# Altium footprint library Footprints.PcbLib: 76 footprints (part 5 of 5)
Each footprint in its own frame and in the unit in brackets; x right, y up, seen from the top. Pads: shape width x height; smd on the part's side, far side on the other; paste and mask are expansions set on the pad; w line width, h text height; cw(c..) or ccw(c..) is an arc to the next point about the centre after c.
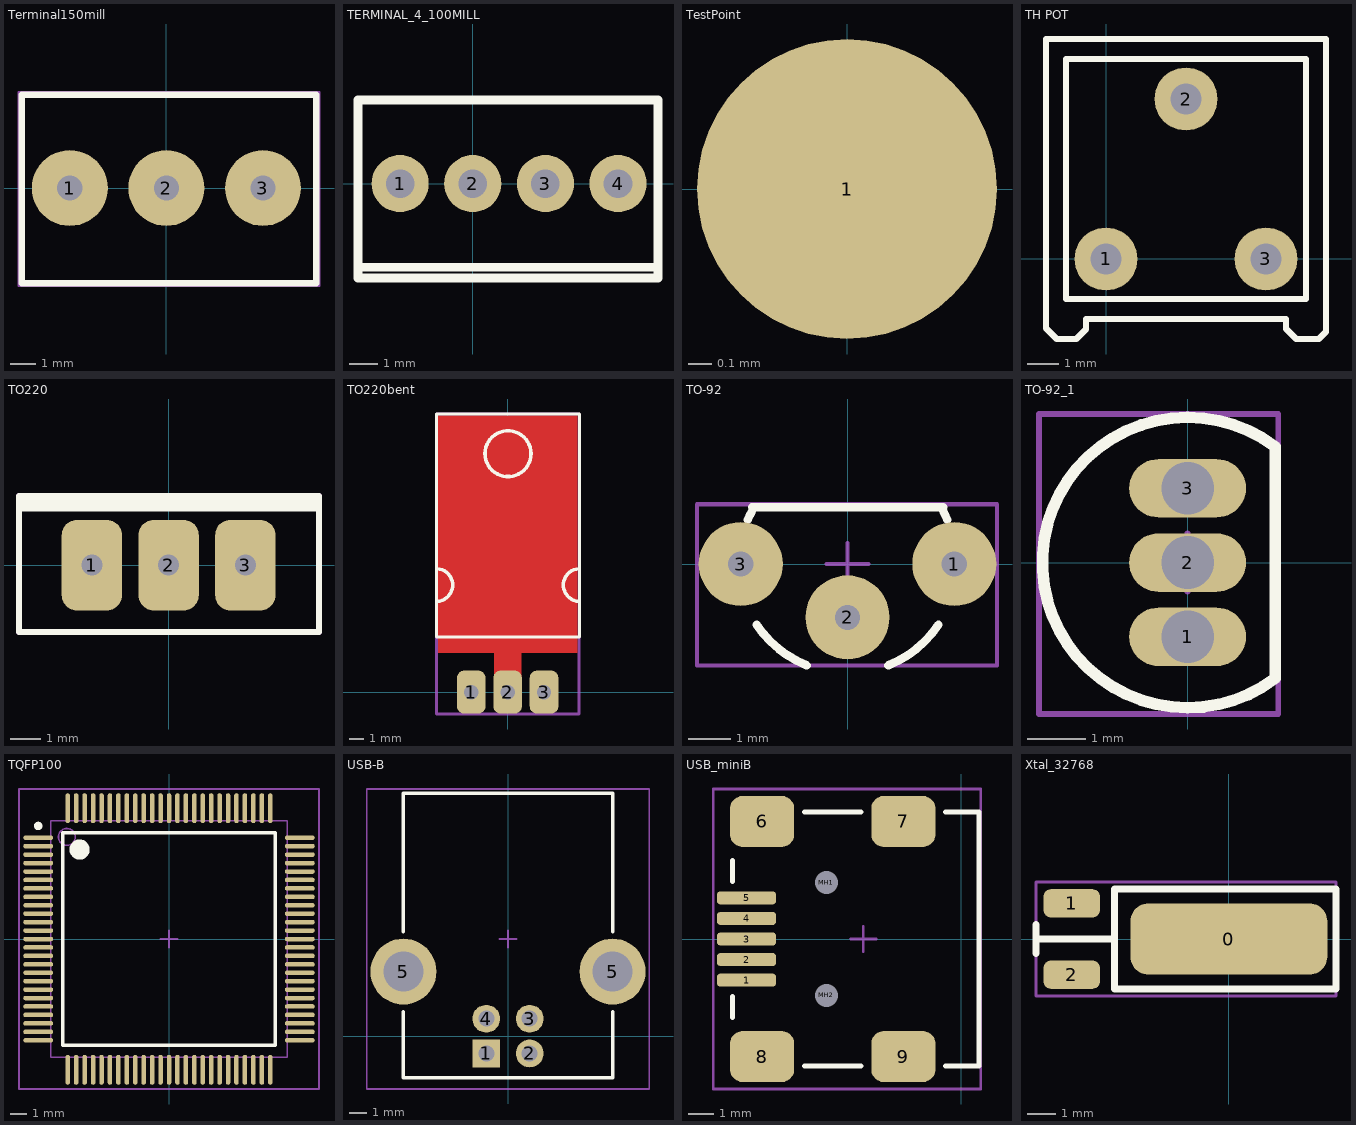
[diagram p4: the footprints below, top view; thin cyan lines are the x and y axes]

## Terminal150mill [mm]
height 8
pads (3):
  round 3 hole 1: 1(-3.81,0) 2(0,0) 3(3.81,0)
Top Overlay:
  lines w0.254: -5.715,-3.759 -5.715,3.683 5.918,3.683 5.918,-3.759 -5.715,-3.759
Mechanical 15:
  lines w0.1: -0.5,0 0.5,0 ; 0,-0.5 0,0.5 ; -5.817,-3.861 -5.817,3.785 6.02,3.785 6.02,-3.861 -5.817,-3.861
3D body "SkrewTerminal 150mill pitch.step": height 8.5, standoff -3.5, extent -5.715,-3.75 5.915,3.75

## TERMINAL_4_100MILL [mm] "Skrew terminal 2.54mm"
height 8.5
pads (4):
  round 2 hole 1: 1(-2.54,0) 2(0,0) 3(2.54,0) 4(5.08,0)
Top Overlay:
  lines w0.3: -3.81,-2.921 6.452,-2.921 ; -4.013,-3.302 6.477,-3.302 6.477,2.921 -4.013,2.921 -4.013,-3.302
Mechanical 15:
  lines w0.1: -0.5,0 0.5,0 ; 0,-0.5 0,0.5 ; -4.013,-3.302 6.477,-3.302 6.477,2.921 -4.013,2.921 -4.013,-3.302
3D body "Terminal2 2.54.step": height 8.64, standoff -1.91, extent -3.982,-3.251 1.238,2.972
3D body "Terminal2 2.54.step": height 8.64, standoff -1.91, extent 1.225,-3.251 6.445,2.972

## TestPoint [mm] "Testpad"
pads (1):
  round 1.3 smd paste-2: 1(0,0)

## TH POT [mm]
pads (3):
  round 2 hole 1: 1(0,0) 2(2.54,5.08) 3(5.08,0)
Top Overlay:
  lines w0.2: -1.905,-2.195 -1.905,6.985 6.985,6.985 6.985,-2.315 6.76,-2.54 6.04,-2.54 5.715,-2.215 5.715,-1.905 -0.635,-1.905 -0.635,-2.235 -0.94,-2.54 -1.56,-2.54 -1.905,-2.195 ; -1.27,-1.27 6.35,-1.27 6.35,6.35 -1.27,6.35 -1.27,-1.27

## TO220 [mm] "TO220 Power device"
height 22
pads (3):
  rrect50% 2x3 hole 0.7: 1(-2.54,0) 2(0,0) 3(2.54,0)
Top Overlay:
  lines w0.2: -4.953,1.905 -4.953,1.88 4.978,1.88 ; -4.902,2.083 4.978,2.083 4.978,2.057 ; -4.953,-2.21 4.978,-2.21 4.978,2.286 -4.953,2.286 -4.953,-2.21
Mechanical 15:
  lines w0.1: -0.5,0 0.5,0 ; 0,-0.5 0,0.5
  lines w0.2: -4.953,-2.21 -4.953,2.286 4.978,2.286 4.978,-2.21 -4.953,-2.21
3D body "TO220.step": height 18.8, standoff -9.98, extent -4.95,-2.214 4.95,2.286

## TO220bent [mm] "TO220 Power device"
height 6
pads (3):
  rrect50% 2x3 hole 1: 1(-2.54,0) 2(0,0) 3(2.54,0)
Top Layer:
  rectangle: -4.851,2.743 4.877,19.304
  rectangle: -0.965,0.686 0.965,2.845
Top Overlay:
  circle w0.254: c0.025,16.637 r1.6
  lines w0.2: -4.953,3.835 5.004,3.835 5.004,19.406 -4.953,19.406 -4.953,3.835
  lines w0.254: -4.914,8.611 cw(c-4.981,7.468) -4.904,6.325 ; 4.955,6.325 cw(c5.032,7.468) 4.965,8.611
Mechanical 15:
  lines w0.1: -0.5,9.906 0.5,9.906 ; 0,9.406 0,10.406
  lines w0.2: -4.953,-1.524 -4.953,2.286 -4.953,19.406 2.108,19.406 4.978,19.406 4.978,-1.524 -4.953,-1.524
3D body "TO220 L.step": height 4.5, standoff -3, extent -4.975,-0.279 5.025,19.425

## TO-92 [mm]
pads (3):
  round 2 hole 0.6: 1(2.54,0) 2(0,-1.27) 3(-2.54,0)
Top Overlay:
  lines w0.2: -2.376,1.056 cw(c0,0) -2.273,1.263 ; -2.273,1.346 2.273,1.346 ; -2.163,-1.442 ccw(c0,0) -0.966,-2.414 ; 0.966,-2.414 ccw(c0,0) 2.163,-1.442 ; 2.273,1.263 cw(c0,0) 2.376,1.056
Mechanical 15:
  lines w0.1: -0.5,0 0.5,0 ; 0,-0.5 0,0.5 ; -3.581,-2.413 3.556,-2.413 3.556,1.422 -3.581,1.422 -3.581,-2.413
3D body "User Library-TO-92-5.step": height 7.34, standoff -0.7, extent -2.84,-2.4 2.84,1.4

## TO-92_1 [mm] "TO, Flat Index; 3 In-Line, Axial Leads; Body Dia. 4.7mm; Leads 0.56 x 0.51 mm (max)"
height 4.96
pads (3):
  oval 2x1 hole 0.9: 1(0,-1.27) 2(0,0) 3(0,1.27)
Top Overlay:
  lines w0.2: 1.5,-1.98 cw(c0,0) 1.5,1.98 1.5,-1.98
Mechanical 13:
  lines w0.1: 1.5,-1.98 cw(c0,0) 1.5,1.98 1.5,-1.98
Mechanical 15:
  lines w0.1: -0.5,0 0.5,0 ; 0,-0.5 0,0.5 ; -2.54,-2.591 1.549,-2.591 1.549,2.54 -2.54,2.54 -2.54,-2.591
3D body "User Library-TO-92_Str.STEP": height 10, standoff -3, extent -2.613,-2.613 1.59,2.613

## TQFP100 [mil] "TSQFP, 100-Leads, Body 16,5x16,5mm (max), Pitch 0,50mm, IPC Low Density"
height 47.24
pads (100):
  oval 70x10.5 smd mask+3: 1(-305.12,236.22) 2(-305.12,216.54) 3(-305.12,196.85) 4(-305.12,177.17) 5(-305.12,157.48) 6(-305.12,137.8) 7(-305.12,118.11) 8(-305.12,98.43) 9(-305.12,78.74) 10(-305.12,59.06) 11(-305.12,39.37) 12(-305.12,19.68) 13(-305.12,0) 14(-305.12,-19.68) 15(-305.12,-39.37) 16(-305.12,-59.06) 17(-305.12,-78.74) 18(-305.12,-98.43) 19(-305.12,-118.11) 20(-305.12,-137.8) 21(-305.12,-157.48) 22(-305.12,-177.17) 23(-305.12,-196.85) 24(-305.12,-216.54) 25(-305.12,-236.22) 51(305.12,-236.22) 52(305.12,-216.54) 53(305.12,-196.85) 54(305.12,-177.17) 55(305.12,-157.48) 56(305.12,-137.8) 57(305.12,-118.11) 58(305.12,-98.43) 59(305.12,-78.74) 60(305.12,-59.06) 61(305.12,-39.37) 62(305.12,-19.68) 63(305.12,0) 64(305.12,19.68) 65(305.12,39.37) 66(305.12,59.06) 67(305.12,78.74) 68(305.12,98.43) 69(305.12,118.11) 70(305.12,137.8) 71(305.12,157.48) 72(305.12,177.17) 73(305.12,196.85) 74(305.12,216.54) 75(305.12,236.22)
  oval 10.5x70 smd mask+3: 26(-236.22,-305.12) 27(-216.54,-305.12) 28(-196.85,-305.12) 29(-177.17,-305.12) 30(-157.48,-305.12) 31(-137.8,-305.12) 32(-118.11,-305.12) 33(-98.43,-305.12) 34(-78.74,-305.12) 35(-59.06,-305.12) 36(-39.37,-305.12) 37(-19.68,-305.12) 38(0,-305.12) 39(19.68,-305.12) 40(39.37,-305.12) 41(59.06,-305.12) 42(78.74,-305.12) 43(98.43,-305.12) 44(118.11,-305.12) 45(137.8,-305.12) 46(157.48,-305.12) 47(177.17,-305.12) 48(196.85,-305.12) 49(216.54,-305.12) 50(236.22,-305.12) 76(236.22,305.12) 77(216.54,305.12) 78(196.85,305.12) 79(177.17,305.12) 80(157.48,305.12) 81(137.8,305.12) 82(118.11,305.12) 83(98.43,305.12) 84(78.74,305.12) 85(59.06,305.12) 86(39.37,305.12) 87(19.68,305.12) 88(0,305.12) 89(-19.68,305.12) 90(-39.37,305.12) 91(-59.06,305.12) 92(-78.74,305.12) 93(-98.43,305.12) 94(-118.11,305.12) 95(-137.8,305.12) 96(-157.48,305.12) 97(-177.17,305.12) 98(-196.85,305.12) 99(-216.54,305.12) 100(-236.22,305.12)
Top Overlay:
  circle w9.84: c-305.12,263.78 r4.92
  circle w23.62: c-208.66,208.66 r11.81
  lines w7.87: -248.03,-248.03 -248.03,248.03 248.03,248.03 248.03,-248.03 -248.03,-248.03
Mechanical 13:
  circle w3.94: c-238.19,238.19 r19.68
  lines w3.94: -275.59,-275.59 -275.59,275.59 275.59,275.59 275.59,-275.59 -275.59,-275.59
Mechanical 15:
  lines w3.94: -19.68,0 19.68,0 ; 0,-19.68 0,19.68 ; -350,-350 -350,350 350,350 350,-350 -350,-350
3D body "TQFP100-0.5.STEP": height 63.49, standoff -0.29, extent -314.95,-314.95 314.97,314.97

## USB-B [mm] "Connector; USB1.1, Type B, Thru-Hole; 4 Position; Right Angle"
height 11.05
pads (6):
  rect 1.6x1.6 hole 0.92: 1(-1.25,-1)
  round 1.6 hole 0.92: 2(1.25,-1) 3(1.25,1) 4(-1.25,1)
  round 3.8 hole 2.3: 5(-6.02,3.71) 5(6.02,3.71)
Top Overlay:
  lines w0.2: -6.02,1.41 -6.02,-2.41 6.02,-2.41 6.02,1.41 ; -6.02,6.01 -6.02,13.99 6.02,13.99 6.02,6.01
Mechanical 15:
  lines w0.1: -0.5,5.588 0.5,5.588 ; 0,5.088 0,6.088 ; -8.128,-3.048 -8.128,14.224 8.128,14.224 8.128,-3.048 -8.128,-3.048
3D body "USB-B.step": height 11.5, standoff -3.92, extent -7.518,-2.912 7.366,14.088

## USB_miniB [mm] "Connector; USB2.0, Type AB, SM; 5 Position; Right Angle"
height 3.9
pads (11):
  rrect50% 2.3x0.5 smd: 1(-8.358,-1.6) 2(-8.358,-0.8) 3(-8.358,0) 4(-8.358,0.8) 5(-8.358,1.6)
  rrect50% 2.5x2 smd: 6(-7.75,4.577) 7(-2.25,4.577) 8(-7.75,-4.577) 9(-2.25,-4.577)
  round 0.6 hole 0.9 unplated: MH1(-5.25,2.2) MH2(-5.25,-2.2)
Top Overlay:
  lines w0.2: -8.9,-3.05 -8.9,-2.25 ; -8.9,2.25 -8.9,3.05 ; -6.1,-4.95 -3.9,-4.95 ; -6.1,4.95 -3.9,4.95 ; -0.6,-4.95 0.7,-4.95 0.7,4.95 -0.6,4.95
Mechanical 15:
  lines w0.1: -4.31,0 -3.31,0 ; -3.81,-0.5 -3.81,0.5 ; -9.652,-5.842 0.762,-5.842 0.762,5.842 -9.652,5.842 -9.652,-5.842
3D body "USB_mini_B.step": height 3.95, standoff -1, extent -8.558,-5.35 0.642,5.35

## Xtal_32768 [mm] "32768Hz watch cristal resonator"
height 2.3
pads (3):
  rrect50% 7x2.54 smd: 0(0,0)
  rrect50% 2x1 smd: 1(-5.588,1.27) 2(-5.588,-1.27)
Top Overlay:
  lines w0.254: -6.858,0.508 -6.858,-0.508 -6.858,0 -4.064,0 -4.064,1.524 ; -4.064,1.524 -4.064,-1.778 3.81,-1.778 3.81,0.889 3.81,1.778 -3.81,1.778 -4.064,1.778 -4.064,1.524
Mechanical 15:
  lines w0.1: -0.5,0 0.5,0 ; 0,-0.5 0,0.5 ; -6.858,-2.032 -6.858,2.032 3.81,2.032 3.81,-2.032 -6.858,-2.032
3D body "AB26TRB.step": height 2, standoff 0, extent -6.278,-1.397 2.722,1.403